# Altium schematic symbol library Capacitor - Aluminium TH.SchLib: 4591 symbols (part 23 of 27) (continued)
## UPW2V100MHD1TO (continued)
CAP ALUM 10UF 20% 350V RADIAL; Part Number: UPW2V100MHD1TO; Manufacturer: Nichicon; TemperatureRange: -40C ~ 105C; Type: Polar; Ripple Current: 82mA @ 120Hz; Value: 10uF; PartId: 23305; Supplier 1: Digi-Key; Supplier Part Number 1: 493-12018-1-ND; ComponentLink1Description: Datasheet; ComponentLink1URL: http://nichicon-us.com/english/products/pdfs/e-upw.pdf; ComponentLink2Description: Digi-Key Listing; ComponentLink2URL: https://www.digikey.com/product-detail/en/nichicon/UPW2V100MHD1TO/493-12018-1-ND/4320126; Tolerance: 20%; Voltage: 350V; Price: 0.81; Device Package: Radial, Can, 12.5mm
footprint CAP AL TH D12.5 L5 H22
pins: 1, 2

## UPW2V220MHD
designator C?, comment 22uF  (value not drawn)
CAP ALUM 22UF 20% 350V RADIAL; Part Number: UPW2V220MHD; Manufacturer: Nichicon; TemperatureRange: -40C ~ 105C; Type: Polar; Ripple Current: 130mA @ 120Hz; Value: 22uF; PartId: 26553; Supplier 1: Digi-Key; Supplier Part Number 1: 493-2049-ND; ComponentLink1Description: Datasheet; ComponentLink1URL: http://nichicon-us.com/english/products/pdfs/e-upw.pdf; ComponentLink2Description: Digi-Key Listing; ComponentLink2URL: https://www.digikey.com/product-detail/en/nichicon/UPW2V220MHD/493-2049-ND/589790; Tolerance: 20%; Voltage: 350V; Price: 1.06; Device Package: Radial, Can, 16mm
footprint CAP AL TH D16 L7.5 H26.5
pins: 1, 2

## UPW2V220MHD1TN
designator C?, comment 22uF  (value not drawn)
CAP ALUM 22UF 20% 350V RADIAL; Part Number: UPW2V220MHD1TN; Manufacturer: Nichicon; TemperatureRange: -40C ~ 105C; Type: Polar; Ripple Current: 130mA @ 120Hz; Value: 22uF; PartId: 26748; Supplier 1: Digi-Key; Supplier Part Number 1: 493-12177-3-ND; ComponentLink1Description: Datasheet; ComponentLink1URL: http://nichicon-us.com/english/products/pdfs/e-upw.pdf; ComponentLink2Description: Digi-Key Listing; ComponentLink2URL: https://www.digikey.com/product-detail/en/nichicon/UPW2V220MHD1TN/493-12177-3-ND/4321320; Tolerance: 20%; Voltage: 350V; Price: 0.5187; Device Package: Radial, Can, 16mm
footprint CAP AL TH D16 L7.5 H27
pins: 1, 2

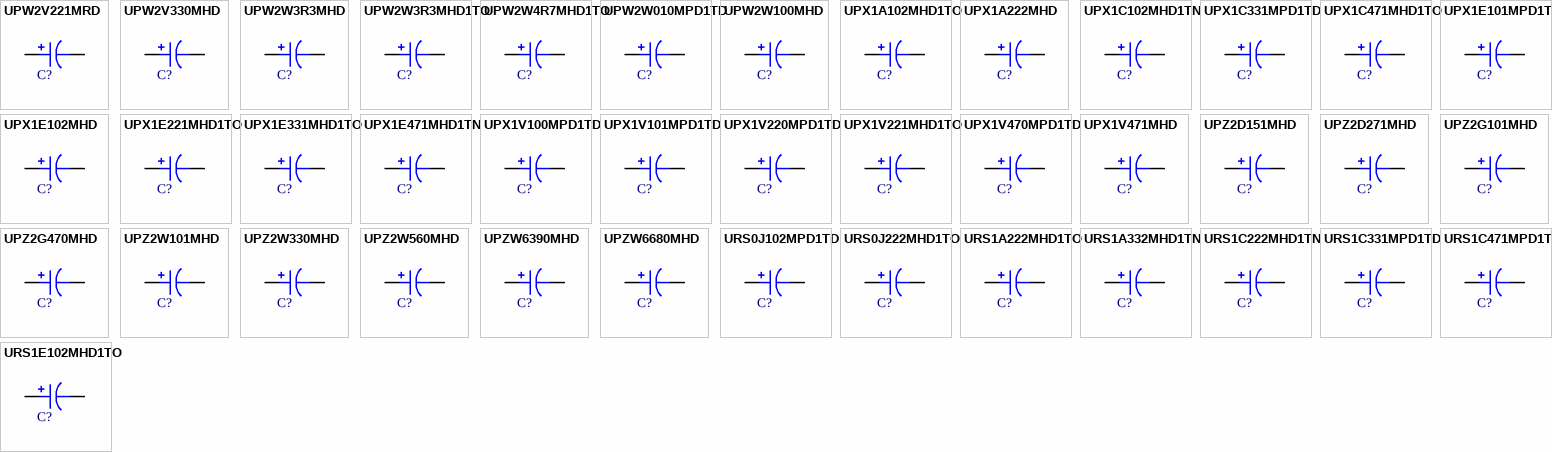
[diagram p99: symbols UPW2V221MRD to URS1E102MHD1TO]

## UPW2V221MRD
designator C?, comment 220uF  (value not drawn)
CAP ALUM 220UF 20% 350V RADIAL; Part Number: UPW2V221MRD; Manufacturer: Nichicon; TemperatureRange: -40C ~ 105C; Type: Polar; Ripple Current: 550mA @ 120Hz; Value: 220uF; PartId: 27519; Supplier 1: Digi-Key; Supplier Part Number 1: 493-2054-ND; ComponentLink1Description: Datasheet; ComponentLink1URL: http://nichicon-us.com/english/products/pdfs/e-upw.pdf; ComponentLink2Description: Digi-Key Listing; ComponentLink2URL: https://www.digikey.com/product-detail/en/nichicon/UPW2V221MRD/493-2054-ND/589795; Tolerance: 20%; Voltage: 350V; Price: 4.64; Device Package: Radial, Can, 25mm
footprint CAP AL TH D25 L12.5 H52
pins: 1, 2

## UPW2V330MHD
designator C?, comment 33uF  (value not drawn)
CAP ALUM 33UF 20% 350V RADIAL; Part Number: UPW2V330MHD; Manufacturer: Nichicon; TemperatureRange: -40C ~ 105C; Type: Polar; Ripple Current: 160mA @ 120Hz; Value: 33uF; PartId: 27102; Supplier 1: Digi-Key; Supplier Part Number 1: 493-2050-ND; ComponentLink1Description: Datasheet; ComponentLink1URL: http://nichicon-us.com/english/products/pdfs/e-upw.pdf; ComponentLink2Description: Digi-Key Listing; ComponentLink2URL: https://www.digikey.com/product-detail/en/nichicon/UPW2V330MHD/493-2050-ND/589791; Tolerance: 20%; Voltage: 350V; Price: 1.74; Device Package: Radial, Can, 16mm
footprint CAP AL TH D16 L7.5 H33.5
pins: 1, 2

## UPW2W3R3MHD
designator C?, comment 3.3uF  (value not drawn)
CAP ALUM 3.3UF 20% 450V RADIAL; Part Number: UPW2W3R3MHD; Manufacturer: Nichicon; TemperatureRange: -25C ~ 105C; Type: Polar; Ripple Current: 41mA @ 120Hz; Value: 3.3uF; PartId: 22853; Supplier 1: Digi-Key; Supplier Part Number 1: 493-2067-ND; ComponentLink1Description: Datasheet; ComponentLink1URL: http://nichicon-us.com/english/products/pdfs/e-upw.pdf; ComponentLink2Description: Digi-Key Listing; ComponentLink2URL: https://www.digikey.com/product-detail/en/nichicon/UPW2W3R3MHD/493-2067-ND/589808; Tolerance: 20%; Voltage: 450V; Price: 0; Device Package: Radial, Can, 12.5mm
footprint CAP AL TH D12.5 L5 H20
pins: 1, 2

## UPW2W3R3MHD1TO
designator C?, comment 3.3uF  (value not drawn)
CAP ALUM 3.3UF 20% 450V RADIAL; Part Number: UPW2W3R3MHD1TO; Manufacturer: Nichicon; TemperatureRange: -25C ~ 105C; Type: Polar; Ripple Current: 41mA @ 120Hz; Value: 3.3uF; PartId: 23273; Supplier 1: Digi-Key; Supplier Part Number 1: 493-12000-1-ND; ComponentLink1Description: Datasheet; ComponentLink1URL: http://nichicon-us.com/english/products/pdfs/e-upw.pdf; ComponentLink2Description: Digi-Key Listing; ComponentLink2URL: https://www.digikey.com/product-detail/en/nichicon/UPW2W3R3MHD1TO/493-12000-1-ND/4320135; Tolerance: 20%; Voltage: 450V; Price: 0.75; Device Package: Radial, Can, 12.5mm
footprint CAP AL TH D12.5 L5 H22
pins: 1, 2

## UPW2W4R7MHD1TO
designator C?, comment 4.7uF  (value not drawn)
CAP ALUM 4.7UF 20% 450V RADIAL; Part Number: UPW2W4R7MHD1TO; Manufacturer: Nichicon; TemperatureRange: -25C ~ 105C; Type: Polar; Ripple Current: 49mA @ 120Hz; Value: 4.7uF; PartId: 23154; Supplier 1: Digi-Key; Supplier Part Number 1: 493-12034-3-ND; ComponentLink1Description: Datasheet; ComponentLink1URL: http://nichicon-us.com/english/products/pdfs/e-upw.pdf; ComponentLink2Description: Digi-Key Listing; ComponentLink2URL: https://www.digikey.com/product-detail/en/nichicon/UPW2W4R7MHD1TO/493-12034-3-ND/4321177; Tolerance: 20%; Voltage: 450V; Price: 0.3024; Device Package: Radial, Can, 12.5mm
footprint CAP AL TH D12.5 L5 H22
pins: 1, 2

## UPW2W010MPD1TD
designator C?, comment 1uF  (value not drawn)
CAP ALUM 1UF 20% 450V RADIAL; Part Number: UPW2W010MPD1TD; Manufacturer: Nichicon; TemperatureRange: -25C ~ 105C; Type: Polar; Ripple Current: 18mA @ 120Hz; Value: 1uF; PartId: 24957; Supplier 1: Digi-Key; Supplier Part Number 1: 493-11823-1-ND; ComponentLink1Description: Datasheet; ComponentLink1URL: http://nichicon-us.com/english/products/pdfs/e-upw.pdf; ComponentLink2Description: Digi-Key Listing; ComponentLink2URL: https://www.digikey.com/product-detail/en/nichicon/UPW2W010MPD1TD/493-11823-1-ND/4320132; Tolerance: 20%; Voltage: 450V; Price: 0.52; Device Package: Radial, Can, 10mm
footprint CAP AL TH D10 L5 H14.5
pins: 1, 2

## UPW2W100MHD
designator C?, comment 10uF  (value not drawn)
CAP ALUM 10UF 20% 450V RADIAL; Part Number: UPW2W100MHD; Manufacturer: Nichicon; TemperatureRange: -25C ~ 105C; Type: Polar; Ripple Current: 75mA @ 120Hz; Value: 10uF; PartId: 26552; Supplier 1: Digi-Key; Supplier Part Number 1: 493-2069-ND; ComponentLink1Description: Datasheet; ComponentLink1URL: http://nichicon-us.com/english/products/pdfs/e-upw.pdf; ComponentLink2Description: Digi-Key Listing; ComponentLink2URL: https://www.digikey.com/product-detail/en/nichicon/UPW2W100MHD/493-2069-ND/589810; Tolerance: 20%; Voltage: 450V; Price: 1.06; Device Package: Radial, Can, 16mm
footprint CAP AL TH D16 L7.5 H26.5
pins: 1, 2

## UPX1A102MHD1TO
designator C?, comment 1000uF  (value not drawn)
CAP ALUM 1000UF 20% 10V RADIAL; Part Number: UPX1A102MHD1TO; Manufacturer: Nichicon; TemperatureRange: -55C ~ 105C; Type: Polar; Ripple Current: 756mA @ 120Hz; Value: 1000uF; PartId: 23669; Supplier 1: Digi-Key; Supplier Part Number 1: 493-12154-1-ND; ComponentLink1Description: Datasheet; ComponentLink1URL: http://nichicon-us.com/english/products/pdfs/e-upx.pdf; ComponentLink2Description: Digi-Key Listing; ComponentLink2URL: https://www.digikey.com/product-detail/en/nichicon/UPX1A102MHD1TO/493-12154-1-ND/4320137; Tolerance: 20%; Voltage: 10V; Price: 0.98; Device Package: Radial, Can, 12.5mm
footprint CAP AL TH D12.5 L5 H26.5
pins: 1, 2

## UPX1A222MHD
designator C?, comment 2200uF  (value not drawn)
CAP ALUM 2200UF 20% 10V RADIAL; Part Number: UPX1A222MHD; Manufacturer: Nichicon; TemperatureRange: -55C ~ 105C; Ripple Current: 1.68A; Value: 2200uF; PartId: 27035; Supplier 1: Digi-Key; Supplier Part Number 1: 493-11276-ND; ComponentLink1Description: Datasheet; ComponentLink1URL: http://nichicon-us.com/english/products/pdfs/e-upx.pdf; ComponentLink2Description: Digi-Key Listing; ComponentLink2URL: https://www.digikey.com/product-detail/en/nichicon/UPX1A222MHD/493-11276-ND/4319341; Tolerance: 20%; Voltage: 10V; Price: 1.52; Device Package: Radial, Can, 16mm
footprint CAP AL TH D16 L7.5 H33.5
pins: 1, 2

## UPX1C102MHD1TN
designator C?, comment 1000uF  (value not drawn)
CAP ALUM 1000UF 20% 16V RADIAL; Part Number: UPX1C102MHD1TN; Manufacturer: Nichicon; TemperatureRange: -55C ~ 105C; Type: Polar; Ripple Current: 1.008A @ 120Hz; Value: 1000uF; PartId: 26520; Supplier 1: Digi-Key; Supplier Part Number 1: 493-12279-3-ND; ComponentLink1Description: Datasheet; ComponentLink1URL: http://nichicon-us.com/english/products/pdfs/e-upx.pdf; ComponentLink2Description: Digi-Key Listing; ComponentLink2URL: https://www.digikey.com/product-detail/en/nichicon/UPX1C102MHD1TN/493-12279-3-ND/4321422; Tolerance: 20%; Voltage: 16V; Price: 0.6422; Device Package: Radial, Can, 16mm
footprint CAP AL TH D16 L7.5 H26.5
pins: 1, 2

## UPX1C331MPD1TD
designator C?, comment 330uF  (value not drawn)
CAP ALUM 330UF 20% 16V RADIAL; Part Number: UPX1C331MPD1TD; Manufacturer: Nichicon; TemperatureRange: -55C ~ 105C; Type: Polar; Ripple Current: 504mA @ 120Hz; Value: 330uF; PartId: 25476; Supplier 1: Digi-Key; Supplier Part Number 1: 493-12040-3-ND; ComponentLink1Description: Datasheet; ComponentLink1URL: http://nichicon-us.com/english/products/pdfs/e-upx.pdf; ComponentLink2Description: Digi-Key Listing; ComponentLink2URL: https://www.digikey.com/product-detail/en/nichicon/UPX1C331MPD1TD/493-12040-3-ND/4321183; Tolerance: 20%; Voltage: 16V; Price: 0.3072; Device Package: Radial, Can, 10mm
footprint CAP AL TH D10 L5 H22
pins: 1, 2

## UPX1C471MHD1TO
designator C?, comment 470uF  (value not drawn)
CAP ALUM 470UF 20% 16V RADIAL; Part Number: UPX1C471MHD1TO; Manufacturer: Nichicon; TemperatureRange: -55C ~ 105C; Type: Polar; Ripple Current: 756mA @ 120Hz; Value: 470uF; PartId: 22991; Supplier 1: Digi-Key; Supplier Part Number 1: 493-12088-1-ND; ComponentLink1Description: Datasheet; ComponentLink1URL: http://nichicon-us.com/english/products/pdfs/e-upx.pdf; ComponentLink2Description: Digi-Key Listing; ComponentLink2URL: https://www.digikey.com/product-detail/en/nichicon/UPX1C471MHD1TO/493-12088-1-ND/4320143; Tolerance: 20%; Voltage: 16V; Price: 0; Device Package: Radial, Can, 12.5mm
footprint CAP AL TH D12.5 L5 H21.5
pins: 1, 2

## UPX1E101MPD1TD
designator C?, comment 100uF  (value not drawn)
CAP ALUM 100UF 20% 25V RADIAL; Part Number: UPX1E101MPD1TD; Manufacturer: Nichicon; TemperatureRange: -55C ~ 105C; Type: Polar; Ripple Current: 315mA @ 120Hz; Value: 100uF; PartId: 24653; Supplier 1: Digi-Key; Supplier Part Number 1: 493-11989-3-ND; ComponentLink1Description: Datasheet; ComponentLink1URL: http://nichicon-us.com/english/products/pdfs/e-upx.pdf; ComponentLink2Description: Digi-Key Listing; ComponentLink2URL: https://www.digikey.com/product-detail/en/nichicon/UPX1E101MPD1TD/493-11989-3-ND/4321132; Tolerance: 20%; Voltage: 25V; Price: 0.2559; Device Package: Radial, Can, 10mm
footprint CAP AL TH D10 L5 H14.5
pins: 1, 2

## UPX1E102MHD
designator C?, comment 1000uF  (value not drawn)
CAP ALUM 1000UF 20% 25V RADIAL; Part Number: UPX1E102MHD; Manufacturer: Nichicon; TemperatureRange: -55C ~ 105C; Ripple Current: 1.68A; Value: 1000uF; PartId: 27081; Supplier 1: Digi-Key; Supplier Part Number 1: 493-11281-ND; ComponentLink1Description: Datasheet; ComponentLink1URL: http://nichicon-us.com/english/products/pdfs/e-upx.pdf; ComponentLink2Description: Digi-Key Listing; ComponentLink2URL: https://www.digikey.com/product-detail/en/nichicon/UPX1E102MHD/493-11281-ND/4319346; Tolerance: 20%; Voltage: 25V; Price: 1.68; Device Package: Radial, Can, 16mm
footprint CAP AL TH D16 L7.5 H33.5
pins: 1, 2

## UPX1E221MHD1TO
designator C?, comment 220uF  (value not drawn)
CAP ALUM 220UF 20% 25V RADIAL; Part Number: UPX1E221MHD1TO; Manufacturer: Nichicon; TemperatureRange: -55C ~ 105C; Type: Polar; Ripple Current: 630mA @ 120Hz; Value: 220uF; PartId: 22976; Supplier 1: Digi-Key; Supplier Part Number 1: 493-12075-1-ND; ComponentLink1Description: Datasheet; ComponentLink1URL: http://nichicon-us.com/english/products/pdfs/e-upx.pdf; ComponentLink2Description: Digi-Key Listing; ComponentLink2URL: https://www.digikey.com/product-detail/en/nichicon/UPX1E221MHD1TO/493-12075-1-ND/4320145; Tolerance: 20%; Voltage: 25V; Price: 0; Device Package: Radial, Can, 12.5mm
footprint CAP AL TH D12.5 L5 H21.5
pins: 1, 2

## UPX1E331MHD1TO
designator C?, comment 330uF  (value not drawn)
CAP ALUM 330UF 20% 25V RADIAL; Part Number: UPX1E331MHD1TO; Manufacturer: Nichicon; TemperatureRange: -55C ~ 105C; Type: Polar; Ripple Current: 756mA @ 120Hz; Value: 330uF; PartId: 23692; Supplier 1: Digi-Key; Supplier Part Number 1: 493-12138-1-ND; ComponentLink1Description: Datasheet; ComponentLink1URL: http://nichicon-us.com/english/products/pdfs/e-upx.pdf; ComponentLink2Description: Digi-Key Listing; ComponentLink2URL: https://www.digikey.com/product-detail/en/nichicon/UPX1E331MHD1TO/493-12138-1-ND/4320146; Tolerance: 20%; Voltage: 25V; Price: 1.05; Device Package: Radial, Can, 12.5mm
footprint CAP AL TH D12.5 L5 H26.5
pins: 1, 2

## UPX1E471MHD1TN
designator C?, comment 470uF  (value not drawn)
CAP ALUM 470UF 20% 25V RADIAL; Part Number: UPX1E471MHD1TN; Manufacturer: Nichicon; TemperatureRange: -55C ~ 105C; Type: Polar; Ripple Current: 1.008A @ 120Hz; Value: 470uF; PartId: 26523; Supplier 1: Digi-Key; Supplier Part Number 1: 493-12289-3-ND; ComponentLink1Description: Datasheet; ComponentLink1URL: http://nichicon-us.com/english/products/pdfs/e-upx.pdf; ComponentLink2Description: Digi-Key Listing; ComponentLink2URL: https://www.digikey.com/product-detail/en/nichicon/UPX1E471MHD1TN/493-12289-3-ND/4321432; Tolerance: 20%; Voltage: 25V; Price: 0.6696; Device Package: Radial, Can, 16mm
footprint CAP AL TH D16 L7.5 H26.5
pins: 1, 2

## UPX1V100MPD1TD
designator C?, comment 10uF  (value not drawn)
CAP ALUM 10UF 20% 35V RADIAL; Part Number: UPX1V100MPD1TD; Manufacturer: Nichicon; TemperatureRange: -55C ~ 105C; Type: Polar; Ripple Current: 220.5mA @ 120Hz; Value: 10uF; PartId: 24611; Supplier 1: Digi-Key; Supplier Part Number 1: 493-11907-3-ND; ComponentLink1Description: Datasheet; ComponentLink1URL: http://nichicon-us.com/english/products/pdfs/e-upx.pdf; ComponentLink2Description: Digi-Key Listing; ComponentLink2URL: https://www.digikey.com/product-detail/en/nichicon/UPX1V100MPD1TD/493-11907-3-ND/4321050; Tolerance: 20%; Voltage: 35V; Price: 0.1964; Device Package: Radial, Can, 10mm
footprint CAP AL TH D10 L5 H14.5
pins: 1, 2

## UPX1V101MPD1TD
designator C?, comment 100uF  (value not drawn)
CAP ALUM 100UF 20% 35V RADIAL; Part Number: UPX1V101MPD1TD; Manufacturer: Nichicon; TemperatureRange: -55C ~ 105C; Type: Polar; Ripple Current: 504mA @ 120Hz; Value: 100uF; PartId: 25470; Supplier 1: Digi-Key; Supplier Part Number 1: 493-12016-3-ND; ComponentLink1Description: Datasheet; ComponentLink1URL: http://nichicon-us.com/english/products/pdfs/e-upx.pdf; ComponentLink2Description: Digi-Key Listing; ComponentLink2URL: https://www.digikey.com/product-detail/en/nichicon/UPX1V101MPD1TD/493-12016-3-ND/4321159; Tolerance: 20%; Voltage: 35V; Price: 0.2872; Device Package: Radial, Can, 10mm
footprint CAP AL TH D10 L5 H22
pins: 1, 2

## UPX1V220MPD1TD
designator C?, comment 22uF  (value not drawn)
CAP ALUM 22UF 20% 35V RADIAL; Part Number: UPX1V220MPD1TD; Manufacturer: Nichicon; TemperatureRange: -55C ~ 105C; Type: Polar; Ripple Current: 252mA @ 120Hz; Value: 22uF; PartId: 24608; Supplier 1: Digi-Key; Supplier Part Number 1: 493-11889-3-ND; ComponentLink1Description: Datasheet; ComponentLink1URL: http://nichicon-us.com/english/products/pdfs/e-upx.pdf; ComponentLink2Description: Digi-Key Listing; ComponentLink2URL: https://www.digikey.com/product-detail/en/nichicon/UPX1V220MPD1TD/493-11889-3-ND/4321032; Tolerance: 20%; Voltage: 35V; Price: 0.1868; Device Package: Radial, Can, 10mm
footprint CAP AL TH D10 L5 H14.5
pins: 1, 2

## UPX1V221MHD1TO
designator C?, comment 220uF  (value not drawn)
CAP ALUM 220UF 20% 35V RADIAL; Part Number: UPX1V221MHD1TO; Manufacturer: Nichicon; TemperatureRange: -55C ~ 105C; Type: Polar; Ripple Current: 756mA @ 120Hz; Value: 220uF; PartId: 23630; Supplier 1: Digi-Key; Supplier Part Number 1: 493-12190-3-ND; ComponentLink1Description: Datasheet; ComponentLink1URL: http://nichicon-us.com/english/products/pdfs/e-upx.pdf; ComponentLink2Description: Digi-Key Listing; ComponentLink2URL: https://www.digikey.com/product-detail/en/nichicon/UPX1V221MHD1TO/493-12190-3-ND/4321333; Tolerance: 20%; Voltage: 35V; Price: 0.4353; Device Package: Radial, Can, 12.5mm
footprint CAP AL TH D12.5 L5 H26.5
pins: 1, 2

## UPX1V470MPD1TD
designator C?, comment 47uF  (value not drawn)
CAP ALUM 47UF 20% 35V RADIAL; Part Number: UPX1V470MPD1TD; Manufacturer: Nichicon; TemperatureRange: -55C ~ 105C; Type: Polar; Ripple Current: 315mA @ 120Hz; Value: 47uF; PartId: 24622; Supplier 1: Digi-Key; Supplier Part Number 1: 493-11928-3-ND; ComponentLink1Description: Datasheet; ComponentLink1URL: http://nichicon-us.com/english/products/pdfs/e-upx.pdf; ComponentLink2Description: Digi-Key Listing; ComponentLink2URL: https://www.digikey.com/product-detail/en/nichicon/UPX1V470MPD1TD/493-11928-3-ND/4321071; Tolerance: 20%; Voltage: 35V; Price: 0.2068; Device Package: Radial, Can, 10mm
footprint CAP AL TH D10 L5 H14.5
pins: 1, 2

## UPX1V471MHD
designator C?, comment 470uF  (value not drawn)
CAP ALUM 470UF 20% 35V RADIAL; Part Number: UPX1V471MHD; Manufacturer: Nichicon; TemperatureRange: -55C ~ 105C; Ripple Current: 1.68A; Value: 470uF; PartId: 27053; Supplier 1: Digi-Key; Supplier Part Number 1: 493-11277-ND; ComponentLink1Description: Datasheet; ComponentLink1URL: http://nichicon-us.com/english/products/pdfs/e-upx.pdf; ComponentLink2Description: Digi-Key Listing; ComponentLink2URL: https://www.digikey.com/product-detail/en/nichicon/UPX1V471MHD/493-11277-ND/4319342; Tolerance: 20%; Voltage: 35V; Price: 1.57; Device Package: Radial, Can, 16mm
footprint CAP AL TH D16 L7.5 H33.5
pins: 1, 2

## UPZ2D151MHD
designator C?, comment 150uF  (value not drawn)
CAP ALUM 150UF 20% 200V RADIAL; Part Number: UPZ2D151MHD; Manufacturer: Nichicon; TemperatureRange: -25C ~ 105C; Ripple Current: 620mA; Value: 150uF; PartId: 24368; Supplier 1: Digi-Key; Supplier Part Number 1: 493-11278-ND; ComponentLink1Description: Datasheet; ComponentLink1URL: http://nichicon-us.com/english/products/pdfs/e-upz.pdf; ComponentLink2Description: Digi-Key Listing; ComponentLink2URL: https://www.digikey.com/product-detail/en/nichicon/UPZ2D151MHD/493-11278-ND/4319343; Tolerance: 20%; Voltage: 200V; Price: 1.57; Device Package: Radial, Can, 12.5mm
footprint CAP AL TH D12.5 L5 H35.5
pins: 1, 2

## UPZ2D271MHD
designator C?, comment 270uF  (value not drawn)
CAP ALUM 270UF 20% 200V RADIAL; Part Number: UPZ2D271MHD; Manufacturer: Nichicon; TemperatureRange: -25C ~ 105C; Type: Polar; Ripple Current: 870mA @ 120Hz; Value: 270uF; PartId: 27212; Supplier 1: Digi-Key; Supplier Part Number 1: 493-4733-ND; ComponentLink1Description: Datasheet; ComponentLink1URL: http://nichicon-us.com/english/products/pdfs/e-upz.pdf; ComponentLink2Description: Digi-Key Listing; ComponentLink2URL: https://www.digikey.com/product-detail/en/nichicon/UPZ2D271MHD/493-4733-ND/3125536; Tolerance: 20%; Voltage: 200V; Price: 2.28; Device Package: Radial, Can, 16mm
footprint CAP AL TH D16 L7.5 H33.5
pins: 1, 2

## UPZ2G101MHD
designator C?, comment 100uF  (value not drawn)
CAP ALUM 100UF 20% 400V RADIAL; Part Number: UPZ2G101MHD; Manufacturer: Nichicon; TemperatureRange: -25C ~ 105C; Ripple Current: 580mA; Value: 100uF; PartId: 27229; Supplier 1: Digi-Key; Supplier Part Number 1: 493-11293-ND; ComponentLink1Description: Datasheet; ComponentLink1URL: http://nichicon-us.com/english/products/pdfs/e-upz.pdf; ComponentLink2Description: Digi-Key Listing; ComponentLink2URL: https://www.digikey.com/product-detail/en/nichicon/UPZ2G101MHD/493-11293-ND/4319358; Tolerance: 20%; Voltage: 400V; Price: 2.43; Device Package: Radial, Can, 16mm
footprint CAP AL TH D16 L7.5 H33.5
pins: 1, 2

## UPZ2G470MHD
designator C?, comment 47uF  (value not drawn)
CAP ALUM 47UF 20% 400V RADIAL; Part Number: UPZ2G470MHD; Manufacturer: Nichicon; TemperatureRange: -25C ~ 105C; Ripple Current: 370mA; Value: 47uF; PartId: 24373; Supplier 1: Digi-Key; Supplier Part Number 1: 493-11280-ND; ComponentLink1Description: Datasheet; ComponentLink1URL: http://nichicon-us.com/english/products/pdfs/e-upz.pdf; ComponentLink2Description: Digi-Key Listing; ComponentLink2URL: https://www.digikey.com/product-detail/en/nichicon/UPZ2G470MHD/493-11280-ND/4319345; Tolerance: 20%; Voltage: 400V; Price: 1.62; Device Package: Radial, Can, 12.5mm
footprint CAP AL TH D12.5 L5 H35.5
pins: 1, 2

## UPZ2W101MHD
designator C?, comment 100uF  (value not drawn)
CAP ALUM 100UF 20% 450V RADIAL; Part Number: UPZ2W101MHD; Manufacturer: Nichicon; TemperatureRange: -25C ~ 105C; Ripple Current: 650mA; Value: 100uF; PartId: 27298; Supplier 1: Digi-Key; Supplier Part Number 1: 493-11302-ND; ComponentLink1Description: Datasheet; ComponentLink1URL: http://nichicon-us.com/english/products/pdfs/e-upz.pdf; ComponentLink2Description: Digi-Key Listing; ComponentLink2URL: https://www.digikey.com/product-detail/en/nichicon/UPZ2W101MHD/493-11302-ND/4319367; Tolerance: 20%; Voltage: 450V; Price: 3.37; Device Package: Radial, Can, 16mm
footprint CAP AL TH D16 L7.5 H33.5
pins: 1, 2

## UPZ2W330MHD
designator C?, comment 33uF  (value not drawn)
CAP ALUM 33UF 20% 450V RADIAL; Part Number: UPZ2W330MHD; Manufacturer: Nichicon; TemperatureRange: -25C ~ 105C; Ripple Current: 280mA; Value: 33uF; PartId: 24367; Supplier 1: Digi-Key; Supplier Part Number 1: 493-11279-ND; ComponentLink1Description: Datasheet; ComponentLink1URL: http://nichicon-us.com/english/products/pdfs/e-upz.pdf; ComponentLink2Description: Digi-Key Listing; ComponentLink2URL: https://www.digikey.com/product-detail/en/nichicon/UPZ2W330MHD/493-11279-ND/4319344; Tolerance: 20%; Voltage: 450V; Price: 1.57; Device Package: Radial, Can, 12.5mm
footprint CAP AL TH D12.5 L5 H35.5
pins: 1, 2

## UPZ2W560MHD
designator C?, comment 56uF  (value not drawn)
CAP ALUM 56UF 20% 450V RADIAL; Part Number: UPZ2W560MHD; Manufacturer: Nichicon; TemperatureRange: -25C ~ 105C; Type: Polar; Ripple Current: 440mA @ 120Hz; Value: 56uF; PartId: 27221; Supplier 1: Digi-Key; Supplier Part Number 1: 493-4730-ND; ComponentLink1Description: Datasheet; ComponentLink1URL: http://nichicon-us.com/english/products/pdfs/e-upz.pdf; ComponentLink2Description: Digi-Key Listing; ComponentLink2URL: https://www.digikey.com/product-detail/en/nichicon/UPZ2W560MHD/493-4730-ND/3125541; Tolerance: 20%; Voltage: 450V; Price: 2.33; Device Package: Radial, Can, 16mm
footprint CAP AL TH D16 L7.5 H33.5
pins: 1, 2

## UPZW6390MHD
designator C?, comment 39uF  (value not drawn)
CAP ALUM 39UF 20% 420V RADIAL; Part Number: UPZW6390MHD; Manufacturer: Nichicon; TemperatureRange: -25C ~ 105C; Type: Polar; Ripple Current: 310mA @ 120Hz; Value: 39uF; PartId: 24399; Supplier 1: Digi-Key; Supplier Part Number 1: 493-4732-ND; ComponentLink1Description: Datasheet; ComponentLink1URL: http://nichicon-us.com/english/products/pdfs/e-upz.pdf; ComponentLink2Description: Digi-Key Listing; ComponentLink2URL: https://www.digikey.com/product-detail/en/nichicon/UPZW6390MHD/493-4732-ND/3125544; Tolerance: 20%; Voltage: 420V; Price: 1.84; Device Package: Radial, Can, 12.5mm
footprint CAP AL TH D12.5 L5 H35.5
pins: 1, 2

## UPZW6680MHD
designator C?, comment 68uF  (value not drawn)
CAP ALUM 68UF 20% 420V RADIAL; Part Number: UPZW6680MHD; Manufacturer: Nichicon; TemperatureRange: -25C ~ 105C; Ripple Current: 510mA; Value: 68uF; PartId: 27213; Supplier 1: Digi-Key; Supplier Part Number 1: 493-11292-ND; ComponentLink1Description: Datasheet; ComponentLink1URL: http://nichicon-us.com/english/products/pdfs/e-upz.pdf; ComponentLink2Description: Digi-Key Listing; ComponentLink2URL: https://www.digikey.com/product-detail/en/nichicon/UPZW6680MHD/493-11292-ND/4319357; Tolerance: 20%; Voltage: 420V; Price: 2.28; Device Package: Radial, Can, 16mm
footprint CAP AL TH D16 L7.5 H33.5
pins: 1, 2

## URS0J102MPD1TD
designator C?, comment 1000uF  (value not drawn)
CAP ALUM 1000UF 20% 6.3V RADIAL; Part Number: URS0J102MPD1TD; Manufacturer: Nichicon; TemperatureRange: -40C ~ 85C; Type: Polar; Ripple Current: 510mA @ 120Hz; Value: 1000uF; PartId: 24435; Supplier 1: Digi-Key; Supplier Part Number 1: 493-11775-3-ND; ComponentLink1Description: Datasheet; ComponentLink1URL: http://nichicon-us.com/english/products/pdfs/e-urs.pdf; ComponentLink2Description: Digi-Key Listing; ComponentLink2URL: https://www.digikey.com/product-detail/en/nichicon/URS0J102MPD1TD/493-11775-3-ND/4320918; Tolerance: 20%; Voltage: 6.3V; Price: 0.1456; Device Package: Radial, Can, 10mm
footprint CAP AL TH D10 L5 H12.5
pins: 1, 2

## URS0J222MHD1TO
designator C?, comment 2200uF  (value not drawn)
CAP ALUM 2200UF 20% 6.3V RADIAL; Part Number: URS0J222MHD1TO; Manufacturer: Nichicon; TemperatureRange: -40C ~ 85C; Type: Polar; Ripple Current: 890mA @ 120Hz; Value: 2200uF; PartId: 22731; Supplier 1: Digi-Key; Supplier Part Number 1: 493-11974-1-ND; ComponentLink1Description: Datasheet; ComponentLink1URL: http://nichicon-us.com/english/products/pdfs/e-urs.pdf; ComponentLink2Description: Digi-Key Listing; ComponentLink2URL: https://www.digikey.com/product-detail/en/nichicon/URS0J222MHD1TO/493-11974-1-ND/4320164; Tolerance: 20%; Voltage: 6.3V; Price: 0; Device Package: Radial, Can, 12.5mm
footprint CAP AL TH D12.5 L5 H16.5
pins: 1, 2

## URS1A222MHD1TO
designator C?, comment 2200uF  (value not drawn)
CAP ALUM 2200UF 20% 10V RADIAL; Part Number: URS1A222MHD1TO; Manufacturer: Nichicon; TemperatureRange: -40C ~ 85C; Type: Polar; Ripple Current: 960mA @ 120Hz; Value: 2200uF; PartId: 22729; Supplier 1: Digi-Key; Supplier Part Number 1: 493-11966-1-ND; ComponentLink1Description: Datasheet; ComponentLink1URL: http://nichicon-us.com/english/products/pdfs/e-urs.pdf; ComponentLink2Description: Digi-Key Listing; ComponentLink2URL: https://www.digikey.com/product-detail/en/nichicon/URS1A222MHD1TO/493-11966-1-ND/4320177; Tolerance: 20%; Voltage: 10V; Price: 0; Device Package: Radial, Can, 12.5mm
footprint CAP AL TH D12.5 L5 H16.5
pins: 1, 2

## URS1A332MHD1TN
designator C?, comment 3300uF  (value not drawn)
CAP ALUM 3300UF 20% 10V RADIAL; Part Number: URS1A332MHD1TN; Manufacturer: Nichicon; TemperatureRange: -40C ~ 85C; Type: Polar; Ripple Current: 1.3A @ 120Hz; Value: 3300uF; PartId: 26231; Supplier 1: Digi-Key; Supplier Part Number 1: 493-12068-3-ND; ComponentLink1Description: Datasheet; ComponentLink1URL: http://nichicon-us.com/english/products/pdfs/e-urs.pdf; ComponentLink2Description: Digi-Key Listing; ComponentLink2URL: https://www.digikey.com/product-detail/en/nichicon/URS1A332MHD1TN/493-12068-3-ND/4321211; Tolerance: 20%; Voltage: 10V; Price: 0.3894; Device Package: Radial, Can, 16mm
footprint CAP AL TH D16 L7.5 H16.5
pins: 1, 2

## URS1C222MHD1TN
designator C?, comment 2200uF  (value not drawn)
CAP ALUM 2200UF 20% 16V RADIAL; Part Number: URS1C222MHD1TN; Manufacturer: Nichicon; TemperatureRange: -40C ~ 85C; Type: Polar; Ripple Current: 1.16A @ 120Hz; Value: 2200uF; PartId: 26236; Supplier 1: Digi-Key; Supplier Part Number 1: 493-12115-3-ND; ComponentLink1Description: Datasheet; ComponentLink1URL: http://nichicon-us.com/english/products/pdfs/e-urs.pdf; ComponentLink2Description: Digi-Key Listing; ComponentLink2URL: https://www.digikey.com/product-detail/en/nichicon/URS1C222MHD1TN/493-12115-3-ND/4321258; Tolerance: 20%; Voltage: 16V; Price: 0.4338; Device Package: Radial, Can, 16mm
footprint CAP AL TH D16 L7.5 H16.5
pins: 1, 2

## URS1C331MPD1TD
designator C?, comment 330uF  (value not drawn)
CAP ALUM 330UF 20% 16V RADIAL; Part Number: URS1C331MPD1TD; Manufacturer: Nichicon; TemperatureRange: -40C ~ 85C; Type: Polar; Ripple Current: 360mA @ 120Hz; Value: 330uF; PartId: 24432; Supplier 1: Digi-Key; Supplier Part Number 1: 493-11676-3-ND; ComponentLink1Description: Datasheet; ComponentLink1URL: http://nichicon-us.com/english/products/pdfs/e-urs.pdf; ComponentLink2Description: Digi-Key Listing; ComponentLink2URL: https://www.digikey.com/product-detail/en/nichicon/URS1C331MPD1TD/493-11676-3-ND/4320819; Tolerance: 20%; Voltage: 16V; Price: 0.1289; Device Package: Radial, Can, 10mm
footprint CAP AL TH D10 L5 H12.5
pins: 1, 2

## URS1C471MPD1TD
designator C?, comment 470uF  (value not drawn)
CAP ALUM 470UF 20% 16V RADIAL; Part Number: URS1C471MPD1TD; Manufacturer: Nichicon; TemperatureRange: -40C ~ 85C; Type: Polar; Ripple Current: 410mA @ 120Hz; Value: 470uF; PartId: 24434; Supplier 1: Digi-Key; Supplier Part Number 1: 493-11709-3-ND; ComponentLink1Description: Datasheet; ComponentLink1URL: http://nichicon-us.com/english/products/pdfs/e-urs.pdf; ComponentLink2Description: Digi-Key Listing; ComponentLink2URL: https://www.digikey.com/product-detail/en/nichicon/URS1C471MPD1TD/493-11709-3-ND/4320852; Tolerance: 20%; Voltage: 16V; Price: 0.1415; Device Package: Radial, Can, 10mm
footprint CAP AL TH D10 L5 H12.5
pins: 1, 2

## URS1E102MHD1TO
designator C?, comment 1000uF  (value not drawn)
CAP ALUM 1000UF 20% 25V RADIAL; Part Number: URS1E102MHD1TO; Manufacturer: Nichicon; TemperatureRange: -40C ~ 85C; Type: Polar; Ripple Current: 830mA @ 120Hz; Value: 1000uF; PartId: 22728; Supplier 1: Digi-Key; Supplier Part Number 1: 493-11967-1-ND; ComponentLink1Description: Datasheet; ComponentLink1URL: http://nichicon-us.com/english/products/pdfs/e-urs.pdf; ComponentLink2Description: Digi-Key Listing; ComponentLink2URL: https://www.digikey.com/product-detail/en/nichicon/URS1E102MHD1TO/493-11967-1-ND/4320200; Tolerance: 20%; Voltage: 25V; Price: 0; Device Package: Radial, Can, 12.5mm
footprint CAP AL TH D12.5 L5 H16.5
pins: 1, 2

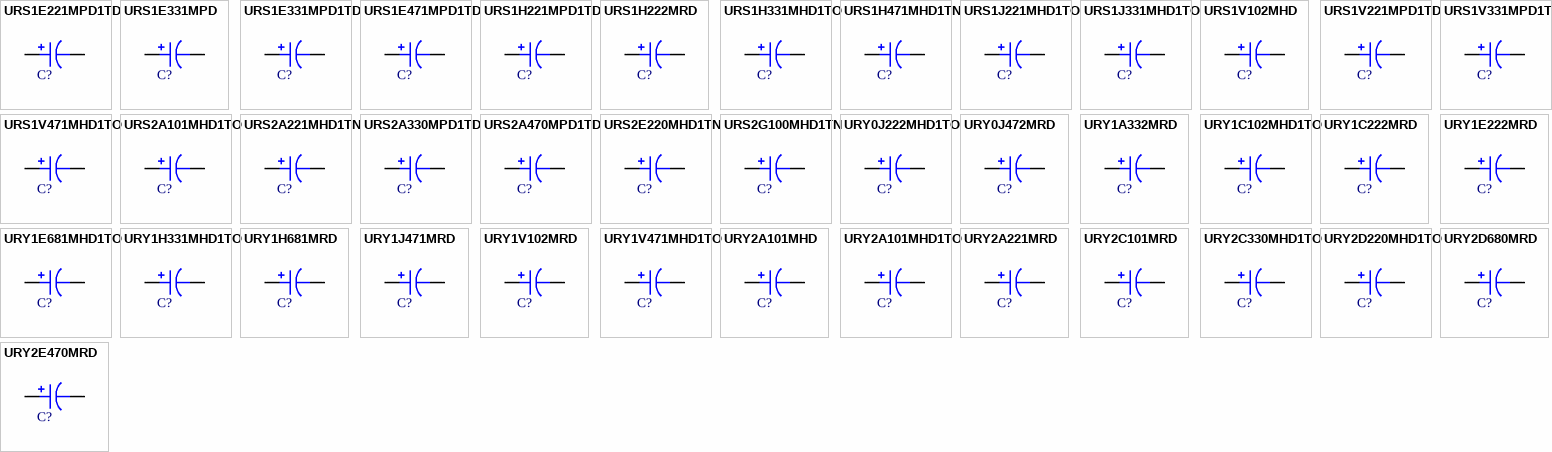
[diagram p100: symbols URS1E221MPD1TD to URY2E470MRD]

## URS1E221MPD1TD
designator C?, comment 220uF  (value not drawn)
CAP ALUM 220UF 20% 25V RADIAL; Part Number: URS1E221MPD1TD; Manufacturer: Nichicon; TemperatureRange: -40C ~ 85C; Type: Polar; Ripple Current: 310mA @ 120Hz; Value: 220uF; PartId: 24433; Supplier 1: Digi-Key; Supplier Part Number 1: 493-11677-3-ND; ComponentLink1Description: Datasheet; ComponentLink1URL: http://nichicon-us.com/english/products/pdfs/e-urs.pdf; ComponentLink2Description: Digi-Key Listing; ComponentLink2URL: https://www.digikey.com/product-detail/en/nichicon/URS1E221MPD1TD/493-11677-3-ND/4320820; Tolerance: 20%; Voltage: 25V; Price: 0.1289; Device Package: Radial, Can, 10mm
footprint CAP AL TH D10 L5 H12.5
pins: 1, 2

## URS1E331MPD
designator C?, comment 330uF  (value not drawn)
CAP ALUM 330UF 20% 25V RADIAL; Part Number: URS1E331MPD; Manufacturer: Nichicon; TemperatureRange: -40C ~ 85C; Type: Polar; Ripple Current: 380mA @ 120Hz; Value: 330uF; PartId: 24451; Supplier 1: Digi-Key; Supplier Part Number 1: URS1E331MPD-ND; ComponentLink1Description: Datasheet; ComponentLink1URL: http://nichicon-us.com/english/products/pdfs/e-urs.pdf; ComponentLink2Description: Digi-Key Listing; ComponentLink2URL: https://www.digikey.com/product-detail/en/nichicon/URS1E331MPD/URS1E331MPD-ND/2428062; Tolerance: 20%; Voltage: 25V; Price: 0.43; Device Package: Radial, Can, 10mm
footprint CAP AL TH D10 L5 H12.5
pins: 1, 2

## URS1E331MPD1TD
designator C?, comment 330uF  (value not drawn)
CAP ALUM 330UF 20% 25V RADIAL; Part Number: URS1E331MPD1TD; Manufacturer: Nichicon; TemperatureRange: -40C ~ 85C; Type: Polar; Ripple Current: 380mA @ 120Hz; Value: 330uF; PartId: 24436; Supplier 1: Digi-Key; Supplier Part Number 1: 493-11781-3-ND; ComponentLink1Description: Datasheet; ComponentLink1URL: http://nichicon-us.com/english/products/pdfs/e-urs.pdf; ComponentLink2Description: Digi-Key Listing; ComponentLink2URL: https://www.digikey.com/product-detail/en/nichicon/URS1E331MPD1TD/493-11781-3-ND/4320924; Tolerance: 20%; Voltage: 25V; Price: 0.1468; Device Package: Radial, Can, 10mm
footprint CAP AL TH D10 L5 H12.5
pins: 1, 2

## URS1E471MPD1TD
designator C?, comment 470uF  (value not drawn)
CAP ALUM 470UF 20% 25V RADIAL; Part Number: URS1E471MPD1TD; Manufacturer: Nichicon; TemperatureRange: -40C ~ 85C; Type: Polar; Ripple Current: 530mA @ 120Hz; Value: 470uF; PartId: 24982; Supplier 1: Digi-Key; Supplier Part Number 1: 493-11841-1-ND; ComponentLink1Description: Datasheet; ComponentLink1URL: http://nichicon-us.com/english/products/pdfs/e-urs.pdf; ComponentLink2Description: Digi-Key Listing; ComponentLink2URL: https://www.digikey.com/product-detail/en/nichicon/URS1E471MPD1TD/493-11841-1-ND/4320208; Tolerance: 20%; Voltage: 25V; Price: 0.54; Device Package: Radial, Can, 10mm
footprint CAP AL TH D10 L5 H14.5
pins: 1, 2